# Altium footprint library LongMen.PcbLib: 245 footprints (part 11 of 16)
Each footprint in its own frame and in the unit in brackets; x right, y up, seen from the top. Pads: shape width x height; smd on the part's side, far side on the other; paste and mask are expansions set on the pad; w line width, h text height; cw(c..) or ccw(c..) is an arc to the next point about the centre after c.
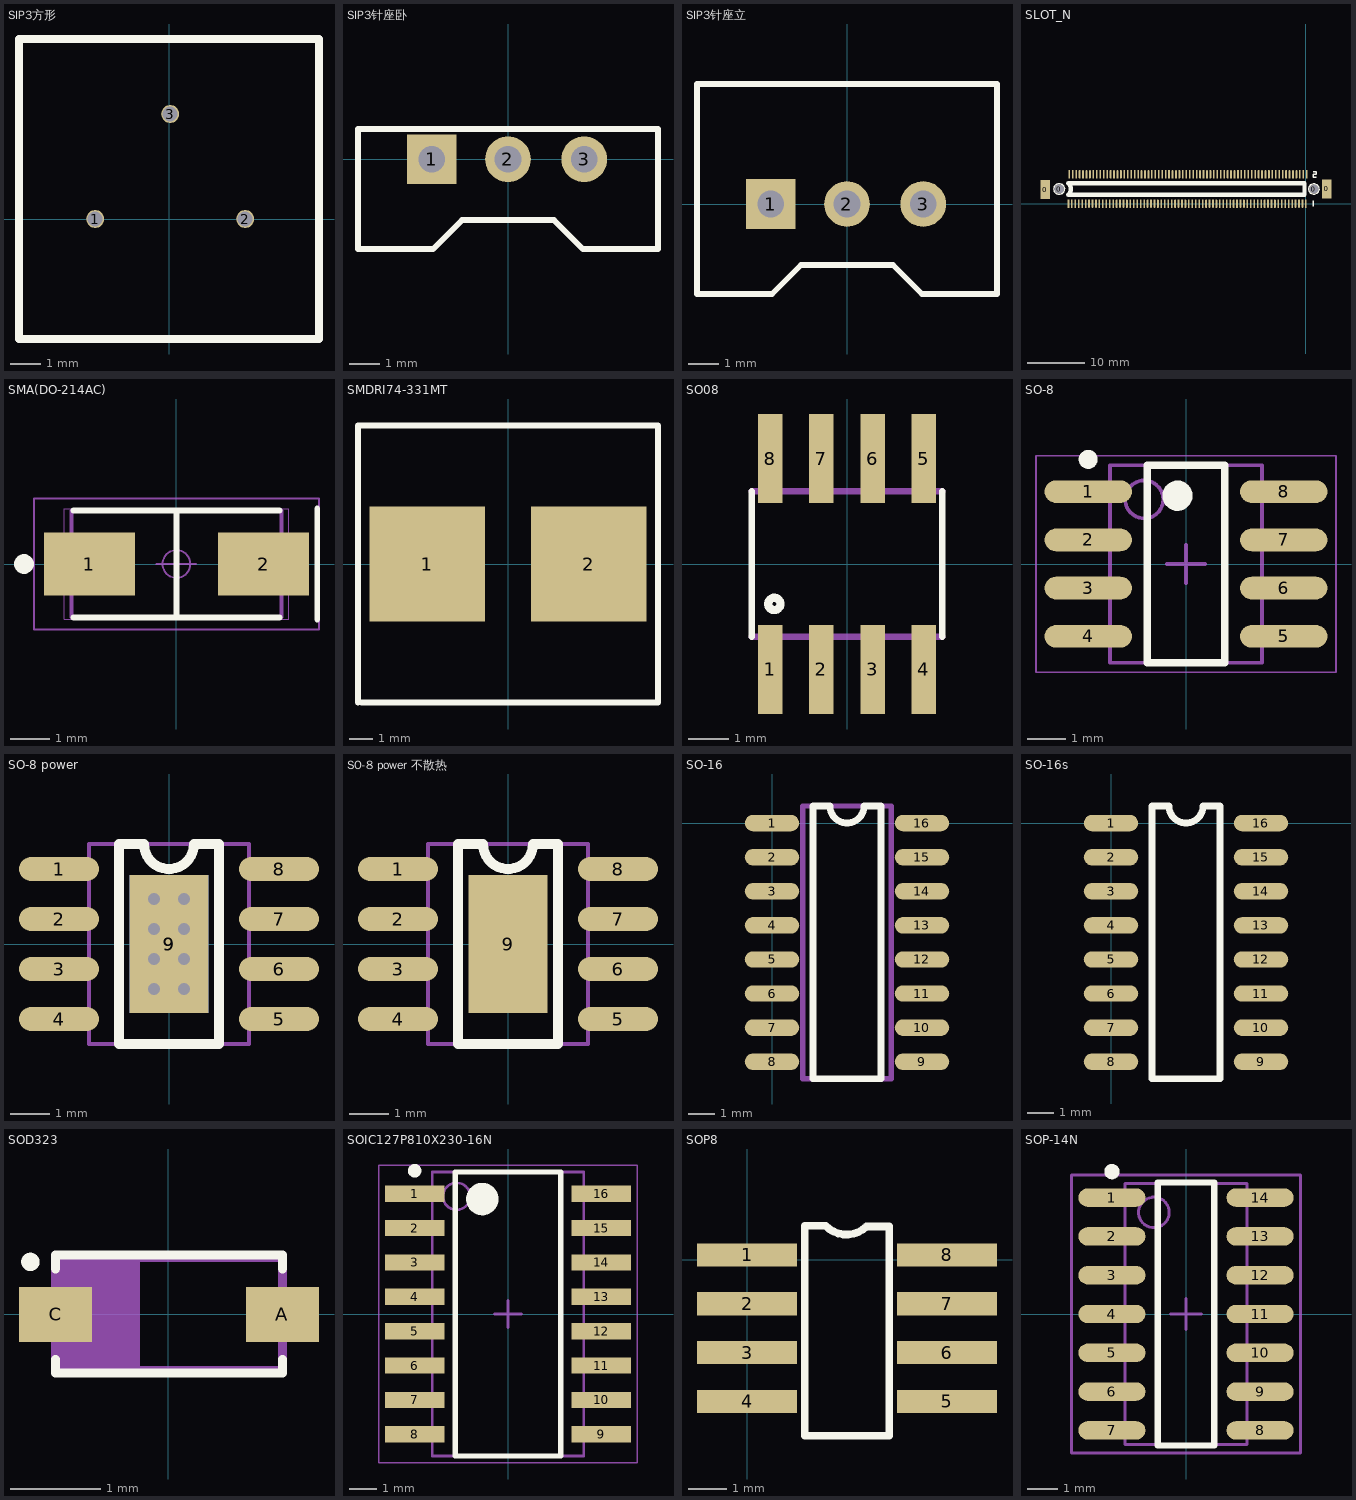
[diagram p10: the footprints below, top view; thin cyan lines are the x and y axes]

## SIP3方形 [mm]
height 5
pads (3):
  round 0.6 hole 0.5: 1(-2.46,0) 2(2.54,0) 3(0.04,3.5)
Top Overlay:
  lines w0.254: -5,-4 -5,6 5,6 5,-4 -5,-4

## SIP3针座卧 [mil]
pads (3):
  rect 65x65 hole 35: 1(-100,0)
  round 60 hole 35: 2(0,0) 3(100,0)
Top Overlay:
  lines w7.87: -196.85,-118.11 -98.43,-118.11 -60.31,-80 60.31,-80 98.43,-118.11 196.85,-118.11 196.85,40 -196.85,40 -196.85,-118.11

## SIP3针座立 [mil]
pads (3):
  rect 65x65 hole 35: 1(-100,0)
  round 60 hole 35: 2(0,0) 3(100,0)
Top Overlay:
  lines w7.87: -196.85,-118.11 -196.85,157.48 196.85,157.48 196.85,-118.11 98.43,-118.11 60.31,-80 -60.31,-80 -98.43,-118.11 -196.85,-118.11

## SLOT_N [mm]
pads (144):
  rect 1.65x3.3 smd: 0(-45.4,2.448) 0(3.6,2.55)
  round 1.6 hole 1.6: 0(-43.002,2.54) 0(1.395,2.53)
  rect 0.3x1.5 smd: 1(0,0) 2(0.152,5.1) 21(-6,0) 22(-5.848,5.1) 41(-12,0) 42(-11.848,5.1) 61(-18,0) 62(-17.848,5.1) 81(-24,0) 82(-23.848,5.1) 101(-30,0) 102(-29.848,5.1) 121(-36,0) 122(-35.848,5.1) 139(-41.4,0) 140(-41.248,5.1)
  oval 0.3x1.5 smd: 3(-0.6,0) 4(-0.448,5.1) 5(-1.2,0) 6(-1.048,5.1) 7(-1.8,0) 8(-1.648,5.1) 9(-2.4,0) 10(-2.248,5.1) 11(-3,0) 12(-2.848,5.1) 13(-3.6,0) 14(-3.448,5.1) 15(-4.2,0) 16(-4.048,5.1) 17(-4.8,0) 18(-4.648,5.1) 19(-5.4,0) 20(-5.248,5.1) 23(-6.6,0) 24(-6.448,5.1) 25(-7.2,0) 26(-7.048,5.1) 27(-7.8,0) 28(-7.648,5.1) 29(-8.4,0) 30(-8.248,5.1) 31(-9,0) 32(-8.848,5.1) 33(-9.6,0) 34(-9.448,5.1) 35(-10.2,0) 36(-10.048,5.1) 37(-10.8,0) 38(-10.648,5.1) 39(-11.4,0) 40(-11.248,5.1) 43(-12.6,0) 44(-12.448,5.1) 45(-13.2,0) 46(-13.048,5.1) 47(-13.8,0) 48(-13.648,5.1) 49(-14.4,0) 50(-14.248,5.1) 51(-15,0) 52(-14.848,5.1) 53(-15.6,0) 54(-15.448,5.1) 55(-16.2,0) 56(-16.048,5.1) 57(-16.8,0) 58(-16.648,5.1) 59(-17.4,0) 60(-17.248,5.1) 63(-18.6,0) 64(-18.448,5.1) 65(-19.2,0) 66(-19.048,5.1) 67(-19.8,0) 68(-19.648,5.1) 69(-20.4,0) 70(-20.248,5.1) 71(-21,0) 72(-20.848,5.1) 73(-21.6,0) 74(-21.448,5.1) 75(-22.2,0) 76(-22.048,5.1) 77(-22.8,0) 78(-22.648,5.1) 79(-23.4,0) 80(-23.248,5.1) 83(-24.6,0) 84(-24.448,5.1) 85(-25.2,0) 86(-25.048,5.1) 87(-25.8,0) 88(-25.648,5.1) 89(-26.4,0) 90(-26.248,5.1) 91(-27,0) 92(-26.848,5.1) 93(-27.6,0) 94(-27.448,5.1) 95(-28.2,0) 96(-28.048,5.1) 97(-28.8,0) 98(-28.648,5.1) 99(-29.4,0) 100(-29.248,5.1) 103(-30.6,0) 104(-30.448,5.1) 105(-31.2,0) 106(-31.048,5.1) 107(-31.8,0) 108(-31.648,5.1) 109(-32.4,0) 110(-32.248,5.1) 111(-33,0) 112(-32.848,5.1) 113(-33.6,0) 114(-33.448,5.1) 115(-34.2,0) 116(-34.048,5.1) 117(-34.8,0) 118(-34.648,5.1) 119(-35.4,0) 120(-35.248,5.1) 123(-36.6,0) 124(-36.448,5.1) 125(-37.2,0) 126(-37.048,5.1) 127(-37.8,0) 128(-37.648,5.1) 129(-38.4,0) 130(-38.248,5.1) 131(-39,0) 132(-38.848,5.1) 133(-39.6,0) 134(-39.448,5.1) 135(-40.2,0) 136(-40.048,5.1) 137(-40.8,0) 138(-40.648,5.1)
Top Overlay:
  circle w0.254: c-43,2.55 r0.925
  circle w0.254: c1.397,2.54 r0.9
  lines w0.254: 1.272,-0.498 1.272,0.518 ; 1.272,5.598 1.78,5.598 1.78,5.09 1.272,5.09 1.272,4.582 1.78,4.582
  lines w0.762: -41.4,1.534 ccw(c-42.416,2.55) -41.4,3.566 -0.252,3.566 -0.252,1.534 -41.4,1.534

## SMA(DO-214AC) [mm]
height 3
pads (2):
  rect 2.3x1.6 smd: 1(-2.2,0) 2(2.2,0)
Top Overlay:
  circle w0.25: c-3.85,0 r0.125
  lines w0.15: -2.6,-1.35 2.6,-1.35 ; -2.6,1.35 2.6,1.35 ; 0,-1.27 0,1.35 ; 3.556,-1.397 3.556,1.397
Mechanical 15:
  lines w0.1: -2.648,-1.335 2.648,-1.335 2.648,1.335 -2.648,1.335 -2.648,-1.335
Mechanical 16:
  circle w0.05: c0,0 r0.35
  lines w0.001: -2.83,-1.4 2.83,-1.4 2.83,1.4 -2.83,1.4 -2.83,-1.4
  lines w0.05: -0.5,0 0.5,0 ; 0,-0.5 0,0.5 ; -3.6,-1.65 3.6,-1.65 3.6,1.65 -3.6,1.65 -3.6,-1.65
3D body: height 3, standoff 0, extent -2.698,-1.385 2.698,1.385

## SMDRI74-331MT [mm]
pads (2):
  rect 5x5 smd: 1(-3.5,0) 2(3.5,0)
Top Overlay:
  lines w0.254: -6.5,-6 -6.5,6 6.5,6 6.5,-6 -6.342,-6

## SO08 [mil] "SO08"
pads (8):
  rect 24x87 smd: 1(-75,-103) 2(-25,-103) 3(25,-103) 4(75,-103) 5(75,103) 6(25,103) 7(-25,103) 8(-75,103)
Top Overlay:
  circle w8: c-71,-39 r6
  lines w6: -92.99,-70.98 -92.99,71 ; 93,-70.98 93,71
Mechanical 16:
  rectangle: -82,-113 -68,-73
  rectangle: -32,-113 -18,-73
  rectangle: 18,-113 32,-73
  rectangle: 68,-113 82,-73
  rectangle: -82,73 -68,113
  rectangle: -32,73 -18,113
  rectangle: 18,73 32,113
  rectangle: 68,73 82,113
  lines w6: -92.99,-70.98 93,-70.98 ; -92.99,71 93,71
3D body: height 34.45, standoff -34.98, extent -96.26,-120.8 96.26,120.8

## SO-8 [mm] "SOIC, 8-Leads, Body 5.10x3.90mm, Pitch 1.27mm, IPC Medium Density"
height 1.9
pads (8):
  oval 2.3x0.6 smd: 1(-2.575,1.905) 2(-2.575,0.635) 3(-2.575,-0.635) 4(-2.575,-1.905) 5(2.575,-1.905) 6(2.575,-0.635) 7(2.575,0.635) 8(2.575,1.905)
Top Overlay:
  circle w0.4: c-0.225,1.8 r0.2
  circle w0.25: c-2.575,2.755 r0.125
  lines w0.2: -1.025,-2.6 1.025,-2.6 1.025,2.6 -1.025,2.6 -1.025,-2.6
Mechanical 13:
  circle w0.1: c-1.1,1.7 r0.5
  lines w0.1: -2,-2.6 2,-2.6 2,2.6 -2,2.6 -2,-2.6
Mechanical 15:
  lines w0.05: -3.95,-2.85 3.95,-2.85 3.95,2.85 -3.95,2.85 -3.95,-2.85
  lines w0.1: -0.5,0 0.5,0 ; 0,-0.5 0,0.5
3D body: height 1.9, standoff 0.25, extent -2,-2.6 2,2.6

## SO-8 power [mil]
pads (10):
  oval 80x24 smd: 1(-110,75) 2(-110,25) 3(-110,-25) 4(-110,-75) 5(110,-75) 6(110,-25) 7(110,25) 8(110,75)
  rect 78.74x137.8 smd: 9(0,0)
  rect 78.74x137.8 smd far side: 9(0,0)
via 15,45 diameter 23.62 hole 11.81
via -15,45 diameter 23.62 hole 11.81
via 15,-45 diameter 23.62 hole 11.81
via -15,-45 diameter 23.62 hole 11.81
via -15,-15 diameter 23.62 hole 11.81
via 15,-15 diameter 23.62 hole 11.81
via 15,15 diameter 23.62 hole 11.81
via -15,15 diameter 23.62 hole 11.81
Top Overlay:
  lines w10: -50,-100 -50,100 -25,100 ccw(c0,100) 25,100 50,100 50,-100 -50,-100
Mechanical 16:
  lines w3.94: -80,100 -80,-100 80,-100 80,100 ; -78.74,100 78.74,100
3D body: height 98.43, standoff 0, extent -81.97,-101.97 81.97,101.97

## SO-8 power 不散热 [mil]
pads (9):
  oval 80x24 smd: 1(-110,75) 2(-110,25) 3(-110,-25) 4(-110,-75) 5(110,-75) 6(110,-25) 7(110,25) 8(110,75)
  rect 78.74x137.8 smd: 9(0,0)
Top Overlay:
  lines w10: -50,-100 50,-100 50,100 25,100 cw(c0,100) -25,100 -50,100 -50,-100
Mechanical 16:
  lines w3.94: -80,100 -80,-100 80,-100 80,100 ; -78.74,100 78.74,100
3D body: height 98.43, standoff 0, extent -81.97,-101.97 81.97,101.97

## SO-16 [mil]
pads (16):
  oval 80x24 smd: 1(0,0) 2(0,-50) 3(0,-100) 4(0,-150) 5(0,-200) 6(0,-250) 7(0,-300) 8(0,-350) 9(220,-350) 10(220,-300) 11(220,-250) 12(220,-200) 13(220,-150) 14(220,-100) 15(220,-50) 16(220,0)
Top Overlay:
  lines w10: 60,-375 60,25 85,25 ccw(c110,25) 135,25 160,25 160,-375 60,-375
Mechanical 1:
  lines w7.87: 45,-375 175,-375 175,25 45,25 45,-375
3D body: height 39.37, standoff 0, extent 41.06,-378.94 178.94,28.94

## SO-16s [mil]
pads (16):
  oval 80x24 smd: 1(0,0) 2(0,-50) 3(0,-100) 4(0,-150) 5(0,-200) 6(0,-250) 7(0,-300) 8(0,-350) 9(220,-350) 10(220,-300) 11(220,-250) 12(220,-200) 13(220,-150) 14(220,-100) 15(220,-50) 16(220,0)
Top Overlay:
  lines w10: 60,-375 160,-375 160,25 135,25 cw(c110,25) 85,25 60,25 60,-375

## SOD323 [mil] "SOD323"
pads (2):
  rect 32x24 smd: A(50,0) C(-49.21,0)
Top Overlay:
  circle w4: c-60.24,23 r2
  lines w4: -49.21,-19.68 -49.21,-25.59 50,-25.59 50,-19.68 ; -49.21,20 -49.21,26 50,26 50,20
Mechanical 16:
  rectangle: 52,-7.87 62,8
  rectangle: -60.97,-7.87 -49.16,8
  rectangle: -49.21,-24.61 -12.3,25
  lines w4: -49.21,-24.61 -49.21,25 50,25 50,-24.61 -49.21,-24.61
3D body: height 35.43, standoff -3.54, extent -49.21,-24.21 49.21,25

## SOIC127P810X230-16N [mm] "SOIC, 16-Leads, Body 10.30x5.50mm, Pitch 1.27mm, IPC Medium Density"
height 2.3
pads (16):
  rect 2.2x0.6 smd: 1(-3.45,4.445) 2(-3.45,3.175) 3(-3.45,1.905) 4(-3.45,0.635) 5(-3.45,-0.635) 6(-3.45,-1.905) 7(-3.45,-3.175) 8(-3.45,-4.445) 9(3.45,-4.445) 10(3.45,-3.175) 11(3.45,-1.905) 12(3.45,-0.635) 13(3.45,0.635) 14(3.45,1.905) 15(3.45,3.175) 16(3.45,4.445)
Top Overlay:
  circle w0.25: c-3.45,5.295 r0.125
  circle w0.6: c-0.95,4.25 r0.3
  lines w0.2: -1.95,-5.25 -1.95,5.25 1.95,5.25 1.95,-5.25 -1.95,-5.25
Mechanical 13:
  circle w0.1: c-1.9,4.35 r0.5
  lines w0.1: -2.8,-5.25 -2.8,5.25 2.8,5.25 2.8,-5.25 -2.8,-5.25
Mechanical 15:
  lines w0.05: -4.775,-5.5 -4.775,5.5 4.775,5.5 4.775,-5.5 -4.775,-5.5
  lines w0.1: -0.5,0 0.5,0 ; 0,-0.5 0,0.5
3D body: height 2.3, standoff 0.1, extent -2.8,-5.25 2.8,5.25

## SOP8 [mm] "Small Outline; 8 Leads; Body Width 4.3 mm; Pitch 1.27 mm"
height 1.5
pads (8):
  rect 2.6x0.6 smd: 1(-0.009,0.127) 2(-0.009,-1.143) 3(-0.009,-2.413) 4(-0.009,-3.683) 5(5.191,-3.683) 6(5.191,-2.413) 7(5.191,-1.143) 8(5.191,0.127)
Top Overlay:
  lines w0.2: 1.491,-4.572 3.691,-4.572 3.691,0.864 3.099,0.864 cw(c2.578,1.41) 2.032,0.889 1.491,0.889 1.491,-4.572

## SOP-14N [mm] "SOP, 14-Leads,"
height 1.75
pads (14):
  oval 2.2x0.6 smd: 1(-2.425,3.81) 2(-2.425,2.54) 3(-2.425,1.27) 4(-2.425,0) 5(-2.425,-1.27) 6(-2.425,-2.54) 7(-2.425,-3.81) 8(2.425,-3.81) 9(2.425,-2.54) 10(2.425,-1.27) 11(2.425,0) 12(2.425,1.27) 13(2.425,2.54) 14(2.425,3.81)
Top Overlay:
  circle w0.25: c-2.425,4.66 r0.125
  lines w0.2: -0.925,-4.3 -0.925,4.3 0.925,4.3 0.925,-4.3 -0.925,-4.3
Mechanical 13:
  circle w0.1: c-1.05,3.325 r0.5
  lines w0.1: -2,-4.275 -2,4.275 2,4.275 2,-4.275 -2,-4.275
Mechanical 15:
  lines w0.1: -0.5,0 0.5,0 ; 0,-0.5 0,0.5 ; -3.75,-4.55 -3.75,4.55 3.75,4.55 3.75,-4.55 -3.75,-4.55
3D body: height 1.75, standoff 0.2, extent -2,-4.275 2,4.275